# Altium footprint library DrPCB.PcbLib: 910 footprints (part 29 of 57)
Each footprint in its own frame and in the unit in brackets; x right, y up, seen from the top. Pads: shape width x height; smd on the part's side, far side on the other; paste and mask are expansions set on the pad; w line width, h text height; cw(c..) or ccw(c..) is an arc to the next point about the centre after c.
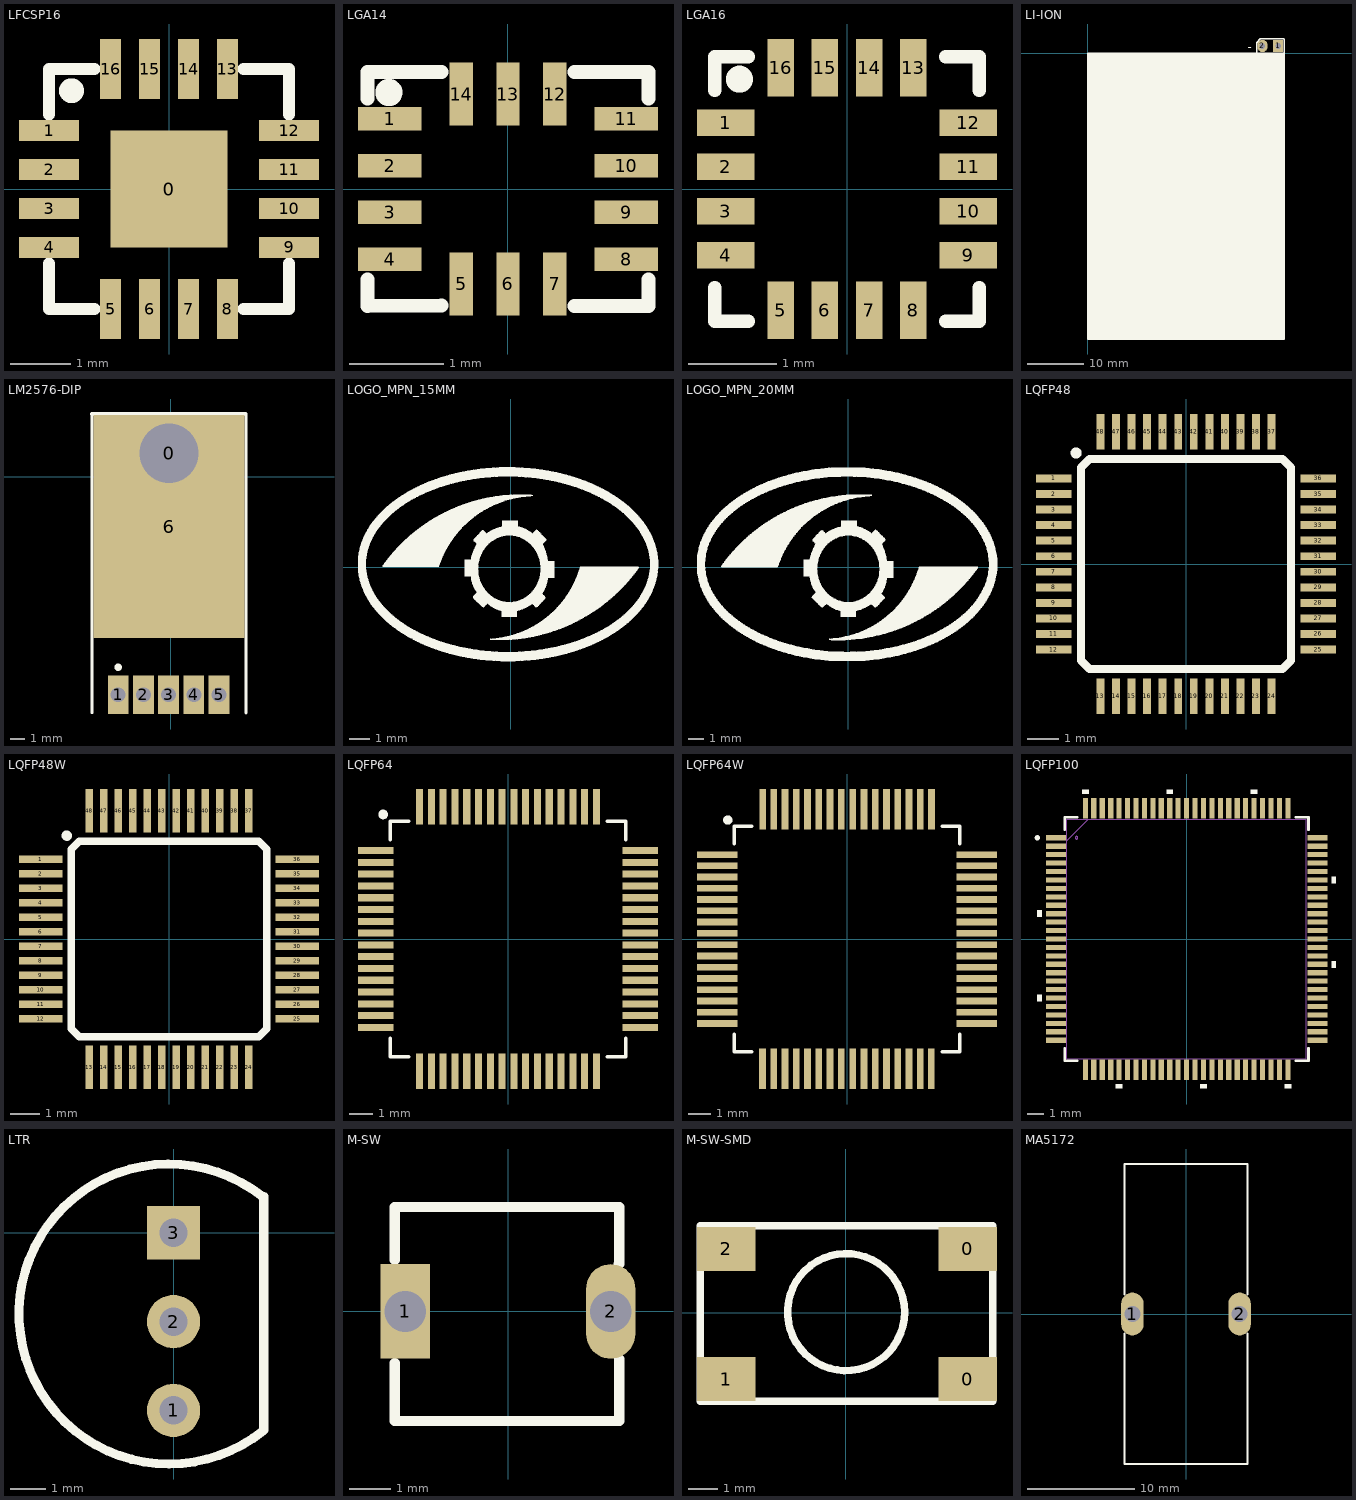
[diagram p28: the footprints below, top view; thin cyan lines are the x and y axes]

## LFCSP16 [mm]
pads (17):
  rect 1.95x1.95 smd: 0(0,0)
  rect 1x0.35 smd: 1(-2,0.975) 2(-2,0.325) 3(-2,-0.325) 4(-2,-0.975) 9(2,-0.975) 10(2,-0.325) 11(2,0.325) 12(2,0.975)
  rect 0.35x1 smd: 5(-0.975,-2) 6(-0.325,-2) 7(0.325,-2) 8(0.975,-2) 13(0.975,2) 14(0.325,2) 15(-0.325,2) 16(-0.975,2)
Top Overlay:
  circle w0.254: c-1.626,1.638 r0.08
  lines w0.2: -2,-1.245 -2,-2 -1.245,-2 ; -2,1.245 -2,2 -1.245,2 ; 1.245,-2 2,-2 2,-1.245 ; 1.245,2 2,2 2,1.245

## LGA14 [mm]
pads (14):
  rect 0.675x0.25 smd: 1(-1.262,0.75) 2(-1.262,0.25) 3(-1.262,-0.25) 4(-1.262,-0.75) 8(1.262,-0.75) 9(1.262,-0.25) 10(1.262,0.25) 11(1.262,0.75)
  rect 0.25x0.675 smd: 5(-0.5,-1.012) 6(0,-1.012) 7(0.5,-1.012) 12(0.5,1.012) 13(0,1.012) 14(-0.5,1.012)
Top Overlay:
  lines w0.15: -1.5,-0.965 -1.5,-1.25 -0.711,-1.245 ; -1.5,0.965 -1.5,1.25 -0.711,1.25 ; 0.711,-1.25 1.498,-1.25 1.498,-0.965 ; 0.711,1.25 1.5,1.25 1.5,0.965
  lines w0.254: -1.257,1.016 cw(c-1.27,1.029) -1.252,1.029
3D body "User Library-LGA-14L.step": height 0.89, standoff 0.01, extent -1.5,-1.25 1.5,1.25

## LGA16 [mm]
pads (16):
  rect 0.65x0.3 smd: 1(-1.375,0.75) 2(-1.375,0.25) 3(-1.375,-0.25) 4(-1.375,-0.75) 9(1.375,-0.75) 10(1.375,-0.25) 11(1.375,0.25) 12(1.375,0.75)
  rect 0.3x0.65 smd: 5(-0.75,-1.375) 6(-0.25,-1.375) 7(0.25,-1.375) 8(0.75,-1.375) 13(0.75,1.375) 14(0.25,1.375) 15(-0.25,1.375) 16(-0.75,1.375)
Top Overlay:
  circle w0.254: c-1.219,1.245 r0.025
  lines w0.15: -1.5,-1.118 -1.5,-1.5 -1.118,-1.5 ; -1.5,1.118 -1.5,1.5 -1.118,1.5 ; 1.118,-1.5 1.5,-1.5 1.5,-1.118 ; 1.118,1.5 1.5,1.5 1.5,1.118
3D body "QFN-16 (3x3).stp": height 0.83, standoff -0.03, extent -1.5,-1.5 1.5,1.5

## LI-ION [mm]
pads (2):
  rect 1.8x2.2 hole 1: 1(33.947,1.257)
  oval 1.8x2.2 hole 1: 2(31.147,1.257)
Top Overlay:
  rectangle: -0.013,-50.978 34.925,0
  lines w0.254: 30.099,0.013 30.099,1.854 30.747,2.502 35.001,2.502 ; 35,0 0,0 0,-51 35,-51 35,2.5
  text "-" at 28.499,0.406 h1.52

## LM2576-DIP [mm]
pads (7):
  round 4 hole 4: 0(-0.127,1.575)
  rect 1.4x2.6 hole 1: 1(-3.552,-14.686) 2(-1.852,-14.686) 3(-0.152,-14.686) 4(1.548,-14.686) 5(3.248,-14.686)
  rect 10.2x15 smd: 6(-0.127,-3.353)
Top Overlay:
  circle w0.25: c-3.552,-12.836 r0.125
  lines w0.2: -5.321,-15.9 -5.321,4.229 ; 5.067,-15.913 5.067,4.229
  lines w0.254: -5.324,4.229 5.042,4.229

## LOGO_MPN_15MM [mm]
Top Overlay:
  drawing of 9069 lines, arcs and shapes, not listed

## LOGO_MPN_20MM [mm]
Top Overlay:
  drawing of 1872 lines, arcs and shapes, not listed

## LQFP48 [mm]
pads (48):
  rect 1.143x0.254 smd: 1(-4.25,2.75) 2(-4.25,2.25) 3(-4.25,1.75) 4(-4.25,1.25) 5(-4.25,0.75) 6(-4.25,0.25) 7(-4.25,-0.25) 8(-4.25,-0.75) 9(-4.25,-1.25) 10(-4.25,-1.75) 11(-4.25,-2.25) 12(-4.25,-2.75) 25(4.25,-2.75) 26(4.25,-2.25) 27(4.25,-1.75) 28(4.25,-1.25) 29(4.25,-0.75) 30(4.25,-0.25) 31(4.25,0.25) 32(4.25,0.75) 33(4.25,1.25) 34(4.25,1.75) 35(4.25,2.25) 36(4.25,2.75)
  rect 0.254x1.143 smd: 13(-2.75,-4.25) 14(-2.25,-4.25) 15(-1.75,-4.25) 16(-1.25,-4.25) 17(-0.75,-4.25) 18(-0.25,-4.25) 19(0.25,-4.25) 20(0.75,-4.25) 21(1.25,-4.25) 22(1.75,-4.25) 23(2.25,-4.25) 24(2.75,-4.25) 37(2.75,4.25) 38(2.25,4.25) 39(1.75,4.25) 40(1.25,4.25) 41(0.75,4.25) 42(0.25,4.25) 43(-0.25,4.25) 44(-0.75,4.25) 45(-1.25,4.25) 46(-1.75,4.25) 47(-2.25,4.25) 48(-2.75,4.25)
Top Overlay:
  circle w0.203: c-3.531,3.569 r0.077
  lines w0.254: -3.375,-3.1 -3.1,-3.375 3.1,-3.375 3.375,-3.1 3.375,3.1 3.1,3.375 -3.1,3.375 -3.375,3.1 -3.375,-3.1
3D body "LQFP48.STEP": height 1.5, standoff 0, extent -4.513,-4.513 4.513,4.513

## LQFP48W [mm]
pads (48):
  rect 1.5x0.254 smd: 1(-4.428,2.756) 2(-4.428,2.25) 3(-4.428,1.75) 4(-4.428,1.25) 5(-4.428,0.75) 6(-4.428,0.25) 7(-4.428,-0.25) 8(-4.428,-0.75) 9(-4.428,-1.25) 10(-4.428,-1.75) 11(-4.428,-2.25) 12(-4.428,-2.75) 25(4.428,-2.75) 26(4.428,-2.25) 27(4.428,-1.75) 28(4.428,-1.25) 29(4.428,-0.75) 30(4.428,-0.25) 31(4.428,0.25) 32(4.428,0.75) 33(4.428,1.25) 34(4.428,1.75) 35(4.428,2.25) 36(4.428,2.756)
  rect 0.254x1.5 smd: 13(-2.75,-4.428) 14(-2.25,-4.428) 15(-1.75,-4.428) 16(-1.25,-4.428) 17(-0.75,-4.428) 18(-0.25,-4.428) 19(0.25,-4.428) 20(0.75,-4.428) 21(1.25,-4.428) 22(1.75,-4.428) 23(2.25,-4.428) 24(2.756,-4.428) 37(2.756,4.428) 38(2.25,4.428) 39(1.75,4.428) 40(1.25,4.428) 41(0.75,4.428) 42(0.25,4.428) 43(-0.25,4.428) 44(-0.75,4.428) 45(-1.25,4.428) 46(-1.75,4.428) 47(-2.25,4.428) 48(-2.75,4.428)
Top Overlay:
  circle w0.203: c-3.531,3.569 r0.077
  lines w0.254: -3.375,-3.1 -3.1,-3.375 3.1,-3.375 3.375,-3.1 3.375,3.1 3.1,3.375 -3.1,3.375 -3.375,3.1 -3.375,-3.1
3D body "LQFP48.STEP": height 1.5, standoff 0, extent -4.513,-4.513 4.513,4.513

## LQFP64 [mm]
pads (64):
  rect 1.5x0.3 smd: 1(-5.613,3.75) 2(-5.613,3.25) 3(-5.613,2.75) 4(-5.613,2.25) 5(-5.613,1.75) 6(-5.613,1.25) 7(-5.613,0.75) 8(-5.613,0.25) 9(-5.613,-0.25) 10(-5.613,-0.75) 11(-5.613,-1.25) 12(-5.613,-1.75) 13(-5.613,-2.25) 14(-5.613,-2.75) 15(-5.613,-3.25) 16(-5.613,-3.75) 33(5.613,-3.75) 34(5.613,-3.25) 35(5.613,-2.75) 36(5.613,-2.25) 37(5.613,-1.75) 38(5.613,-1.25) 39(5.613,-0.75) 40(5.613,-0.25) 41(5.613,0.25) 42(5.613,0.75) 43(5.613,1.25) 44(5.613,1.75) 45(5.613,2.25) 46(5.613,2.75) 47(5.613,3.25) 48(5.613,3.75)
  rect 0.3x1.5 smd: 17(-3.75,-5.613) 18(-3.25,-5.613) 19(-2.75,-5.613) 20(-2.25,-5.613) 21(-1.75,-5.613) 22(-1.25,-5.613) 23(-0.75,-5.613) 24(-0.25,-5.613) 25(0.25,-5.613) 26(0.75,-5.613) 27(1.25,-5.613) 28(1.75,-5.613) 29(2.25,-5.613) 30(2.75,-5.613) 31(3.25,-5.613) 32(3.75,-5.613) 49(3.75,5.613) 50(3.25,5.613) 51(2.75,5.613) 52(2.25,5.613) 53(1.75,5.613) 54(1.25,5.613) 55(0.75,5.613) 56(0.25,5.613) 57(-0.25,5.613) 58(-0.75,5.613) 59(-1.25,5.613) 60(-1.75,5.613) 61(-2.25,5.613) 62(-2.75,5.613) 63(-3.25,5.613) 64(-3.75,5.613)
Top Overlay:
  circle w0.254: c-5.296,5.283 r0.077
  lines w0.152: -5.004,-4.22 -5.004,-5.004 -4.22,-5.004 ; -5.004,4.22 -5.004,5.004 -4.22,5.004 ; 4.22,-5.004 5.004,-5.004 5.004,-4.22 ; 4.22,5.004 5.004,5.004 5.004,4.22
3D body "User Library-TQFP64_Grid_0_5.STEP": height 1.2, standoff 0, extent -6,-6 6,6

## LQFP64W [mm]
pads (64):
  rect 1.8x0.3 smd: 1(-5.763,3.746) 2(-5.763,3.25) 3(-5.763,2.75) 4(-5.763,2.25) 5(-5.763,1.75) 6(-5.763,1.25) 7(-5.763,0.75) 8(-5.763,0.25) 9(-5.763,-0.25) 10(-5.763,-0.75) 11(-5.763,-1.25) 12(-5.763,-1.75) 13(-5.763,-2.25) 14(-5.763,-2.75) 15(-5.763,-3.25) 16(-5.763,-3.75) 33(5.763,-3.75) 34(5.763,-3.25) 35(5.763,-2.75) 36(5.763,-2.25) 37(5.763,-1.75) 38(5.763,-1.25) 39(5.763,-0.75) 40(5.763,-0.25) 41(5.763,0.25) 42(5.763,0.75) 43(5.763,1.25) 44(5.763,1.75) 45(5.763,2.25) 46(5.763,2.75) 47(5.763,3.25) 48(5.763,3.746)
  rect 0.3x1.8 smd: 17(-3.75,-5.763) 18(-3.25,-5.763) 19(-2.75,-5.763) 20(-2.25,-5.763) 21(-1.75,-5.763) 22(-1.25,-5.763) 23(-0.75,-5.763) 24(-0.25,-5.763) 25(0.25,-5.763) 26(0.75,-5.763) 27(1.25,-5.763) 28(1.75,-5.763) 29(2.25,-5.763) 30(2.75,-5.763) 31(3.25,-5.763) 32(3.746,-5.763) 49(3.75,5.763) 50(3.25,5.763) 51(2.75,5.763) 52(2.25,5.763) 53(1.75,5.763) 54(1.25,5.763) 55(0.75,5.763) 56(0.25,5.763) 57(-0.25,5.763) 58(-0.75,5.763) 59(-1.25,5.763) 60(-1.75,5.763) 61(-2.25,5.763) 62(-2.75,5.763) 63(-3.25,5.763) 64(-3.746,5.763)
Top Overlay:
  circle w0.254: c-5.296,5.283 r0.077
  lines w0.152: -5.004,-4.22 -5.004,-5.004 -4.22,-5.004 ; -5.004,4.22 -5.004,5.004 -4.22,5.004 ; 4.22,-5.004 5.004,-5.004 5.004,-4.22 ; 4.22,5.004 5.004,5.004 5.004,4.22
3D body "User Library-TQFP64_Grid_0_5.STEP": height 1.2, standoff 0, extent -6,-6 6,6

## LQFP100 [mil]
pads (100):
  rect 47x12 smd: 1(-305.12,236.22) 2(-305.12,216.54) 3(-305.12,196.85) 4(-305.12,177.17) 5(-305.12,157.48) 6(-305.12,137.8) 7(-305.12,118.11) 8(-305.12,98.43) 9(-305.12,78.74) 10(-305.12,59.06) 11(-305.12,39.37) 12(-305.12,19.69) 13(-305.12,0) 14(-305.12,-19.68) 15(-305.12,-39.37) 16(-305.12,-59.05) 17(-305.12,-78.74) 18(-305.12,-98.43) 19(-305.12,-118.11) 20(-305.12,-137.8) 21(-305.12,-157.48) 22(-305.12,-177.17) 23(-305.12,-196.85) 24(-305.12,-216.54) 25(-305.12,-236.22) 51(305.12,-236.22) 52(305.12,-216.54) 53(305.12,-196.85) 54(305.12,-177.17) 55(305.12,-157.48) 56(305.12,-137.8) 57(305.12,-118.11) 58(305.12,-98.43) 59(305.12,-78.74) 60(305.12,-59.05) 61(305.12,-39.37) 62(305.12,-19.68) 63(305.12,0) 64(305.12,19.69) 65(305.12,39.37) 66(305.12,59.06) 67(305.12,78.74) 68(305.12,98.43) 69(305.12,118.11) 70(305.12,137.8) 71(305.12,157.48) 72(305.12,177.17) 73(305.12,196.85) 74(305.12,216.54) 75(305.12,236.22)
  rect 12x47 smd: 26(-236.22,-305.12) 27(-216.54,-305.12) 28(-196.85,-305.12) 29(-177.17,-305.12) 30(-157.48,-305.12) 31(-137.8,-305.12) 32(-118.11,-305.12) 33(-98.43,-305.12) 34(-78.74,-305.12) 35(-59.05,-305.12) 36(-39.37,-305.12) 37(-19.68,-305.12) 38(0,-305.12) 39(19.69,-305.12) 40(39.37,-305.12) 41(59.06,-305.12) 42(78.74,-305.12) 43(98.43,-305.12) 44(118.11,-305.12) 45(137.8,-305.12) 46(157.48,-305.12) 47(177.17,-305.12) 48(196.85,-305.12) 49(216.54,-305.12) 50(236.22,-305.12) 76(236.22,305.12) 77(216.54,305.12) 78(196.85,305.12) 79(177.17,305.12) 80(157.48,305.12) 81(137.8,305.12) 82(118.11,305.12) 83(98.43,305.12) 84(78.74,305.12) 85(59.06,305.12) 86(39.37,305.12) 87(19.69,305.12) 88(0,305.12) 89(-19.68,305.12) 90(-39.37,305.12) 91(-59.05,305.12) 92(-78.74,305.12) 93(-98.43,305.12) 94(-118.11,305.12) 95(-137.8,305.12) 96(-157.48,305.12) 97(-177.17,305.12) 98(-196.85,305.12) 99(-216.54,305.12) 100(-236.22,305.12)
Top Overlay:
  circle w6: c-348.46,236.22 r3
  region: -338.62,66.56 -348.62,66.56 -348.62,51.56 -338.62,51.56
  region: -338.62,-130.3 -348.62,-130.3 -348.62,-145.3 -338.62,-145.3
  region: -149.98,-338.62 -164.98,-338.62 -164.98,-348.62 -149.98,-348.62
  region: 46.87,-338.62 31.87,-338.62 31.87,-348.62 46.87,-348.62
  region: 243.72,-338.62 228.72,-338.62 228.72,-348.62 243.72,-348.62
  region: 338.62,-51.55 348.62,-51.55 348.62,-66.56 338.62,-66.56
  region: 338.62,145.3 348.62,145.3 348.62,130.3 338.62,130.3
  region: 164.98,338.62 149.98,338.62 149.98,348.62 164.98,348.62
  region: -31.87,338.62 -46.87,338.62 -46.87,348.62 -31.87,348.62
  region: -228.72,338.62 -243.72,338.62 -243.72,348.62 -228.72,348.62
  lines w6: -284.5,-255.32 -284.5,-284.5 -255.32,-284.5 ; -284.5,255.32 -284.5,284.5 -255.32,284.5 ; 255.32,-284.5 284.5,-284.5 284.5,-255.32 ; 255.32,284.5 284.5,284.5 284.5,255.32
Mechanical 13:
  circle w0: c-256.62,236.22 r3
  lines w1: -279.5,229.5 -229.5,279.5 ; -279.5,-279.5 279.5,-279.5 279.5,279.5 -279.5,279.5 -279.5,-279.5
3D body "STM32H750VBT6.stp": height 62.99, standoff 0, extent -314.96,-314.96 314.96,314.96
3D body: height 10, standoff 0, extent 0,0 10,10

## LTR [mm]
pads (3):
  round 1.5 hole 0.8: 1(0,-5) 2(0,-2.5)
  rect 1.5x1.5 hole 0.8: 3(0,0)
Top Overlay:
  lines w0.254: 2.494,1.024 ccw(c-0.127,-2.286) 2.526,-5.57 2.54,-5.556 2.54,1.016

## M-SW [mm]
pads (2):
  rect 1.2x2.3 hole 1: 1(-2.5,0)
  oval 1.2x2.3 hole 1: 2(2.5,0)
Top Overlay:
  lines w0.254: -2.756,-1.257 -2.754,-1.259 -2.754,-2.667 2.707,-2.667 2.707,-1.17 2.705,-1.168 ; -2.756,1.257 -2.754,1.259 -2.754,2.54 2.707,2.54 2.707,1.158 2.692,1.143
3D body "Tactile Switch.step": height 7.01, standoff -3.99, extent -3.025,-3.051 2.975,2.949

## M-SW-SMD [mm]
pads (4):
  rect 2x1.5 smd: 0(4.162,-2.27) 0(4.162,2.175) 1(-4.093,-2.27) 2(-4.093,2.175)
Top Overlay:
  circle w0.254: c0.003,0.016 r2
  lines w0.254: -4.982,-3.032 5.018,-3.032 5.018,2.968 -4.982,2.968 -4.982,-3.032

## MA5172 [mm]
pads (2):
  oval 2.1x4 hole 1.5: 1(-5,0) 2(5,0)
Top Overlay:
  lines w0.2: -5.75,-1.832 -5.75,-14 5.75,-14 5.75,-1.832 ; -5.75,1.832 -5.75,14 5.75,14 5.75,1.832
3D body "Coilcraft-MA5172-AE.step": height 28.6, standoff -12, extent -6.15,-14.3 6.15,14.3